# Altium footprint library IC.PcbLib: 85 footprints (part 6 of 6)
Each footprint in its own frame and in the unit in brackets; x right, y up, seen from the top. Pads: shape width x height; smd on the part's side, far side on the other; paste and mask are expansions set on the pad; w line width, h text height; cw(c..) or ccw(c..) is an arc to the next point about the centre after c.
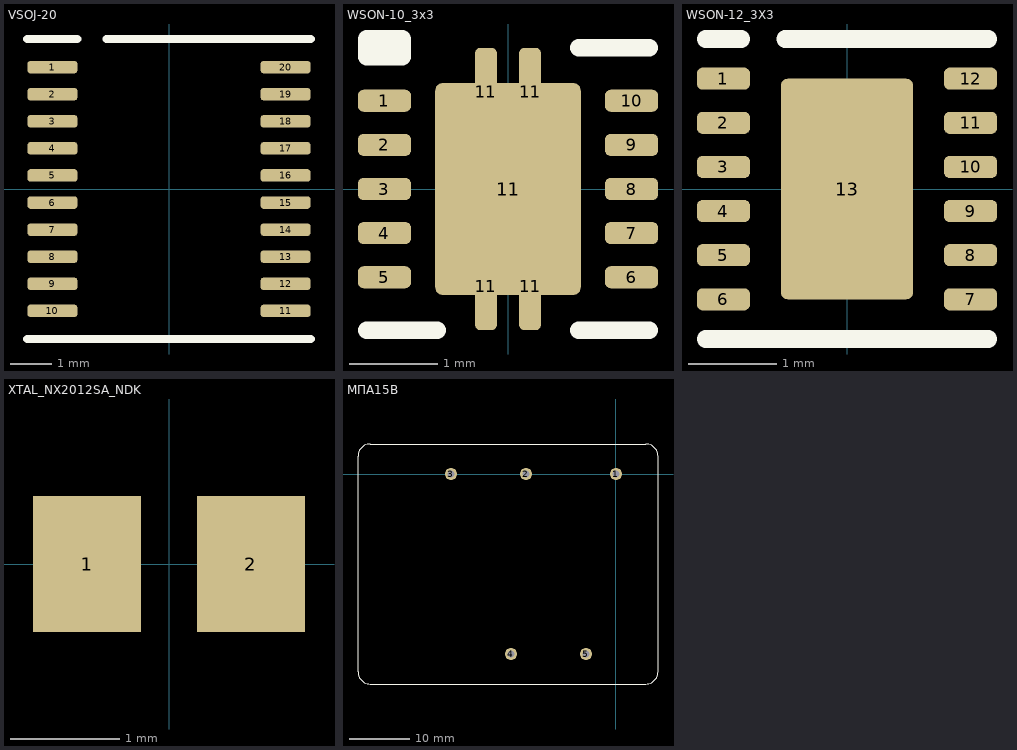
[diagram p5: the footprints below, top view; thin cyan lines are the x and y axes]

## VSOJ-20 [mm]
pads (20):
  rrect50% 1.2x0.3 smd: 1(-2.797,2.925) 2(-2.797,2.275) 3(-2.797,1.625) 4(-2.797,0.975) 5(-2.797,0.325) 6(-2.797,-0.325) 7(-2.797,-0.975) 8(-2.797,-1.625) 9(-2.797,-2.275) 10(-2.797,-2.925) 11(2.797,-2.925) 12(2.797,-2.275) 13(2.797,-1.625) 14(2.797,-0.975) 15(2.797,-0.325) 16(2.797,0.325) 17(2.797,0.975) 18(2.797,1.625) 19(2.797,2.275) 20(2.797,2.925)
Top Overlay:
  lines w0.2: -3.4,-3.6 3.4,-3.6 ; -3.4,3.6 -2.2,3.6 ; -1.5,3.6 3.4,3.6
3D body "RTC-8564JEB3ROHS_EPS.step": height 1.5, standoff 0, extent -3,-3.505 3,3.505

## WSON-10_3x3 [mm]
pads (15):
  rrect50% 0.6x0.25 smd: 1(-1.4,1) 2(-1.4,0.5) 3(-1.4,0) 4(-1.4,-0.5) 5(-1.4,-1) 6(1.4,-1) 7(1.4,-0.5) 8(1.4,0) 9(1.4,0.5) 10(1.4,1)
  rrect50% 0.25x1 smd: 11(-0.25,-1.1) 11(-0.25,1.1) 11(0.25,-1.1) 11(0.25,1.1)
  rrect10% 1.65x2.4 smd: 11(0,0)
Top Overlay:
  rectangle: -1.6,1.5 -1.2,1.7
  lines w0.2: -1.6,-1.6 -0.8,-1.6 ; -1.5,1.7 -1.2,1.7 -1.2,1.5 -1.6,1.5 -1.6,1.7 -1.4,1.7 ; 0.8,-1.6 1.6,-1.6 ; 0.8,1.6 1.6,1.6
Top Solder:
  region: -0.325,-1.7 -0.375,-1.65 -0.375,-1.2 -0.775,-1.2 -0.825,-1.15 -0.825,1.15 -0.775,1.2 -0.375,1.2 -0.375,1.65 -0.325,1.7 -0.175,1.7 -0.125,1.65 -0.125,1.2 0.125,1.2 0.125,1.65 0.175,1.7 0.325,1.7 0.375,1.65 0.375,1.2 0.775,1.2 0.825,1.15 0.825,-1.15 0.775,-1.2 0.375,-1.2 0.375,-1.65 0.325,-1.7 0.175,-1.7 0.125,-1.65 0.125,-1.2 -0.125,-1.2 -0.125,-1.65 -0.175,-1.7
3D body "DSC0010J.stp": height 0.8, standoff 0, extent -1.5,-1.5 1.5,1.5

## WSON-12_3X3 [mm]
pads (13):
  rrect50% 0.6x0.25 smd: 1(-1.4,1.25) 2(-1.4,0.75) 3(-1.4,0.25) 4(-1.4,-0.25) 5(-1.4,-0.75) 6(-1.4,-1.25) 7(1.4,-1.25) 8(1.4,-0.75) 9(1.4,-0.25) 10(1.4,0.25) 11(1.4,0.75) 12(1.4,1.25)
  rrect10% 1.5x2.5 smd: 13(0,0)
Top Overlay:
  lines w0.2: -1.6,-1.7 0,-1.7 1.6,-1.7 ; -1.6,1.7 -1.2,1.7 ; -0.7,1.7 1.6,1.7
3D body "TPS63710(WSON-12-3x3-0_5).STEP": height 0.8, standoff 0, extent -1.5,-1.5 1.5,1.5

## XTAL_NX2012SA_NDK [mil]
pads (2):
  rect 39x49 smd paste+0 mask+0: 1(-29.5,0) 2(29.5,0)
3D body "XTAL_NX2012SA_NDK.step": height 24.02, standoff 0, extent -41.5,-24.49 41.5,24.49

## МПА15В [mm]
pads (5):
  round 2 hole 1.2 mask+0: 1(0,0) 2(-15,0) 3(-27.5,0) 4(-17.5,-30) 5(-5,-30)
Top Overlay:
  lines w0.2: -43,-33 ccw(c-41,-33) -41,-35 5,-35 ccw(c5,-33) 7,-33 7,3 ccw(c5,3) 5,5 -41,5 ccw(c-41,3) -43,3 -43,-33
3D body: height 11.5, standoff 0, extent -43,-35 7,5